# Altium footprint library SecurityBoard.PcbLib: 36 footprints (part 3 of 3)
Each footprint in its own frame and in the unit in brackets; x right, y up, seen from the top. Pads: shape width x height; smd on the part's side, far side on the other; paste and mask are expansions set on the pad; w line width, h text height; cw(c..) or ccw(c..) is an arc to the next point about the centre after c.
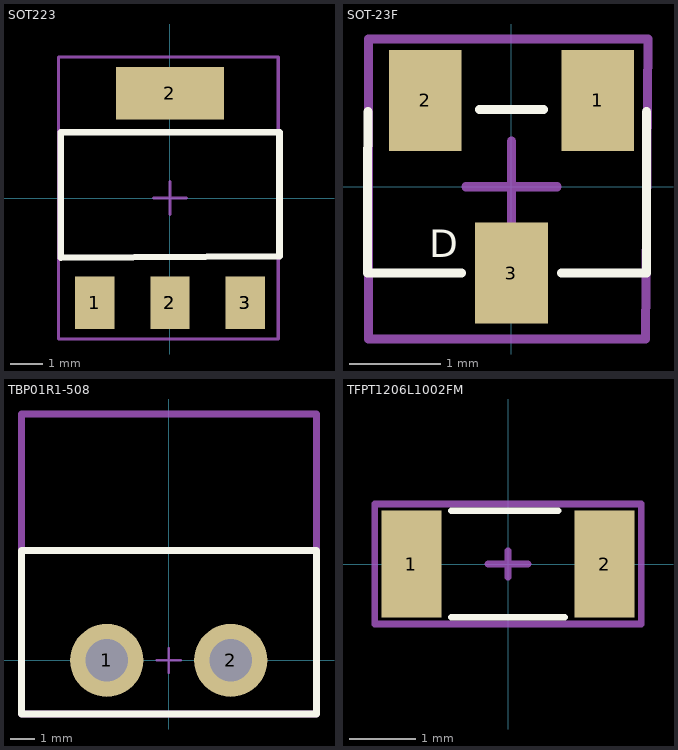
[diagram p2: the footprints below, top view; thin cyan lines are the x and y axes]

## SOT223 [mm]
pads (6):
  rect 1.2x1.6 smd: 1(-2.3,-3.2) 2(0,-3.2) 2(0,-3.2) 3(2.3,-3.2) 3(2.3,-3.2)
  rect 3.3x1.6 smd: 2(0,3.2)
Top Overlay:
  lines w0.2: -3.328,2 -3.328,-1.823 3.339,-1.782 3.339,2 3.2,2 -3.3,2
Top Component Center:
  lines w0.1: -0.5,0 0.5,0 ; 0,-0.5 0,0.5 ; -3.4,-4.3 3.3,-4.3 3.3,4.3 -3.4,4.3 -3.4,-4.3
Top Designator:
  lines w0.1: -3.4,-4.3 3.3,-4.3 3.3,4.3 -3.4,4.3 -3.4,-4.3
  text "'.Designator'" at -3,-1 h1.2
3D body "SOT-223_(4).step": height 1.68, standoff 0, extent -3.25,-3.28 3.25,3.68

## SOT-23F [mm]
pads (3):
  rect 0.8x1.11 smd mask+0.05: 1(0.95,0.95) 2(-0.95,0.95) 3(0,-0.95)
Top Overlay:
  lines w0.1: -1.579,0.825 -1.582,0.05 -1.582,-0.95 -0.55,-0.95 ; -0.35,0.85 0.35,0.85 ; 0.55,-0.95 1.484,-0.95 1.484,0.825
  text "D" at -0.907,-0.776 h0.3
Top Component Center:
  lines w0.1: 0,-0.5 0,0 ; 0,0.5 0,0 ; 0.5,0 -0.5,0 0,0 ; -1.575,-1.675 1.475,-1.675 1.5,1.625 -1.575,1.625 -1.575,-1.675
Top Designator:
  lines w0.1: -1.575,-1.675 1.475,-1.675 1.5,1.625 -1.575,1.625 -1.575,-1.675
  text "'.Designator'" at -1.269,-0.342 h0.3
3D body "SOT23F.STEP": height 0.91, standoff 0, extent -1.5,-1.25 1.4,1.15

## TBP01R1-508 [mm]
pads (2):
  round 3 hole 1.75: 1(-2.54,0) 2(2.54,0)
Top Overlay:
  lines w0.3: -6.04,-2.2 6.06,-2.2 6.06,4.5 -6.04,4.5 -6.04,-2.2
Top Component Center:
  lines w0.1: -0.5,0 0.5,0 ; 0,-0.5 0,0.5
  lines w0.3: -6.04,-2.2 6.06,-2.2 6.06,10.1 -6.04,10.1 -6.04,-2.2
Top Designator:
  lines w0.3: -6.04,-2.2 6.06,-2.2 6.06,10.1 -6.04,10.1 -6.04,-2.2
  text "'.Designator'" at -5.5,1.5 h1
3D body "CUI_DEVICES_TBP01R1-508-02BK.step": height 8.51, standoff -3.99, extent -5.9,-2 5.86,10

## TFPT1206L1002FM [mm]
pads (2):
  rect 0.9x1.6 smd mask+0.05: 1(-1.45,0) 2(1.45,0)
Top Overlay:
  lines w0.1: -0.85,-0.8 0.85,-0.8 ; -0.85,0.8 0.75,0.8
Top Component Center:
  lines w0.1: -0.3,0 0.3,0 ; 0,-0.2 0,0.2 ; -2,-0.9 2,-0.9 2,0.9 -2,0.9 -2,-0.9
Top Designator:
  lines w0.1: -2,-0.9 2,-0.9 2,0.9 -2,0.9 -2,-0.9
  text "'.Designator'" at -1.4,-0.6 h0.5
3D body "RES1206.step": height 1.25, standoff 0, extent -2.27,-0.8 2.27,0.8